# Altium footprint library DIP Component.PcbLib: 327 footprints (part 10 of 21)
Each footprint in its own frame and in the unit in brackets; x right, y up, seen from the top. Pads: shape width x height; smd on the part's side, far side on the other; paste and mask are expansions set on the pad; w line width, h text height; cw(c..) or ccw(c..) is an arc to the next point about the centre after c.
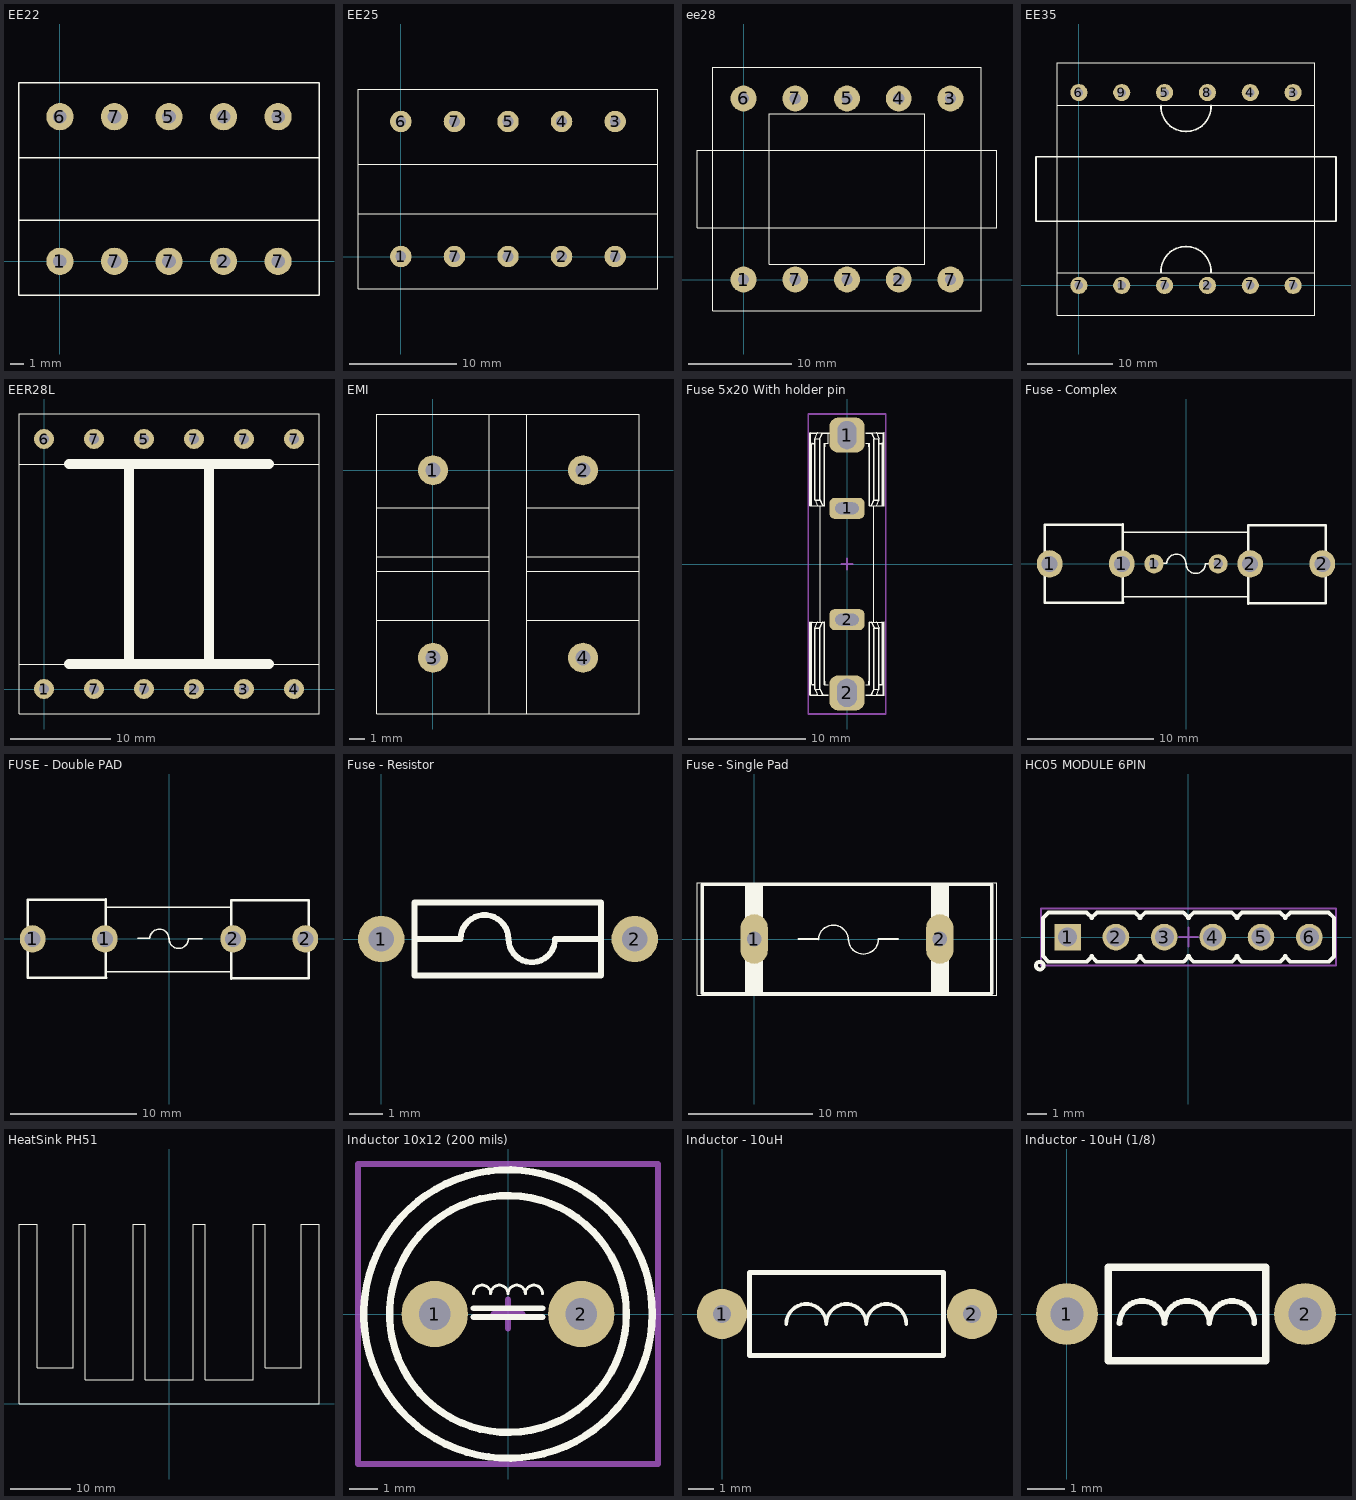
[diagram p9: the footprints below, top view; thin cyan lines are the x and y axes]

## EE22 [mm] "EE22"
pads (10):
  round 2 hole 1: 1(0,0) 2(12,0) 3(16,10.6) 4(12,10.6) 5(8,10.6) 6(0,10.6) 7(4,0) 7(4,10.6) 7(8,0) 7(16,0)
Top Overlay:
  lines w0.1: -3,3 19,3 ; -3,7.6 19,7.6 ; -3,-2.5 -1.5,-2.5 19,-2.5 19,13.1 -2.5,13.1 -3,13.1 -3,0 -3,-2.5

## EE25 [mm] "EE25"
pads (10):
  round 2 hole 1: 1(0,0) 2(15,0) 3(20,12.6) 4(15,12.6) 5(10,12.6) 6(0,12.6) 7(5,0) 7(5,12.6) 7(10,0) 7(20,0)
Top Overlay:
  lines w0.1: -4,4 24,4 ; -4,8.6 24,8.6 ; -4,-3 -4,0 -4,15.6 23,15.6 24,15.6 24,-3 -3,-3 -4,-3

## ee28 [mm] "ee28"
pads (10):
  round 2.5 hole 1.1: 1(0,0) 2(15,0) 3(20,17.5) 4(15,17.5) 5(10,17.5) 6(0,17.5) 7(5,0) 7(5,17.5) 7(10,0) 7(20,0)
Top Overlay:
  lines w0.1: -4.5,5 -4.5,12.5 24.5,12.5 24.5,8.5 24.5,5 -3.5,5 -4.5,5 ; -3,-3 -3,-2.5 -3,20.5 -2,20.5 23,20.5 23,-3 22.5,-3 -3,-3 ; 2.5,1.5 2.5,16 17.5,16 17.5,1.5 2.5,1.5

## EE35 [mm] "EE35"
pads (12):
  round 2 hole 1: 1(5,0) 2(15,0) 3(25,22.5) 4(20,22.5) 5(10,22.5) 6(0,22.5) 7(0,0) 7(10,0) 7(20,0) 7(25,0) 8(15,22.5) 9(5,22.5)
Top Overlay:
  lines w0.1: -2.5,1.5 27.5,1.5 ; -2.5,21 27.5,21 ; -2.5,-3.5 27.5,-3.5 27.5,-3 27.5,23.5 27.5,26 -2.5,26 -2.5,9 -2.5,0 -2.5,-3.5
  lines w0.2: 9.585,1.5 cw(c12.5,1.625) 15.415,1.5 ; 9.585,21 ccw(c12.5,20.875) 15.415,21 ; -5,7.5 30,7.5 30,12.5 30,15 25,15 -5,15 -5,8 -5,7.5

## EER28L [mm] "EER28L"
pads (12):
  round 2 hole 1: 1(0,0) 2(15,0) 3(20,0) 4(25,0) 5(10,25) 6(0,25) 7(5,0) 7(5,25) 7(10,0) 7(15,25) 7(20,25) 7(25,25)
Top Overlay:
  lines w0.1: -2.5,2.5 27.5,2.5 ; -2.5,22.5 27.5,22.5 ; -2.5,-2.5 -2.5,21 -2.5,27.5 27.5,27.5 27.5,12.5 27.5,-2.5 -2.5,-2.5
  lines w1: 2.5,2.5 22.5,2.5 ; 2.5,22.5 22.5,22.5 ; 8.5,22 8.5,2.5 16.5,2.5 16.5,22.5

## EMI [mm] "EMI"
pads (4):
  round 2 hole 1: 1(0,0) 2(10,0) 3(0,-12.5) 4(10,-12.5)
Top Overlay:
  lines w0.05: 3.75,-16.25 3.75,3.75 ; 3.75,-10 -3.75,-10 -3.75,-6.75 3.75,-6.75 3.75,-5.75 -3.75,-5.75 -3.75,-2.5 3.75,-2.5 ; 6.25,-16.25 6.25,3.75 ; 6.25,-10 13.75,-10 ; 6.25,-6.75 13.75,-6.75 ; 6.25,-5.75 13.75,-5.75 ; 6.25,-2.5 13.75,-2.5 ; -3.75,-16.25 -3.75,3.75 13.75,3.75 13.75,2.5 13.75,0 13.75,-16.25 -3.75,-16.25

## Fuse 5x20 With holder pin [mm] "Dsigner : Abbas Basereh"
height 8
pads (4):
  rrect50% 3x1.8 hole 1 slot 2 at 0 deg: 1(0,4.75) 2(0,-4.75)
  rrect50% 3x3 hole 1.6 slot 2.4 at 90 deg: 1(0,11)
  rrect50% 3x3 hole 1.7 slot 2.4 at 90 deg: 2(0,-11)
Top Overlay:
  drawing of 353 lines, arcs and shapes, not listed
Mechanical 15:
  lines w0.15: -0.5,0 0.5,0 ; 0,-0.5 0,0.5 ; -3.3,-12.8 3.3,-12.8 3.3,12.8 -3.3,12.8 -3.3,-12.8
3D body "User Library-Clips FC-201 with fuse 5x20.STEP": height 8.63, standoff -3.56, extent -3.173,-11.689 3.174,11.689

## Fuse - Complex [mil]
pads (6):
  oval 80x85 hole 50: 1(-425,0) 1(-200,0) 2(200,0) 2(425,0)
  round 60 hole 30: 1(-100,0) 2(100,0)
Top Overlay:
  lines w3.94: -197.37,99.1 194.69,99.1 ; -197.05,-102 194.69,-102
  lines w5: -97.77,1.22 -59.98,1.22 ; -59.97,1.22 cw(c-30,0) 0,0 ccw(c30,0) 60,0 104.09,0
  lines w7.87: -197.44,122.64 -197.05,0.2 -197.05,-121.06 ; -197.05,122.24 -440,122.24 -440,-121.46 -195.87,-121.46 ; 193.9,-123.43 435,-123.43 435,120.28 198.23,120.28 ; 194.69,-123.82 194.69,119.88
3D body "Fuse Leg_2009.STEP": height 377.88, standoff -129.94, extent -434,-121.46 -194,122.25
3D body "Fuse Small 1A.STEP": height 350.39, standoff 149.61, extent -392,-101 383.59,99.79
3D body "Fuse Leg_2009.STEP": height 377.88, standoff -129.94, extent 196,-119 436,124.71

## FUSE - Double PAD [mil]
pads (4):
  oval 80x85 hole 50: 1(-425,0) 1(-200,0) 2(200,0) 2(425,0)
Top Overlay:
  lines w3.94: -197.37,99.1 194.69,99.1 ; -197.05,-102 194.69,-102
  lines w5: -97.77,1.22 -59.98,1.22 ; -59.97,1.22 cw(c-30,0) 0,0 ccw(c30,0) 60,0 104.09,0
  lines w7.87: -197.44,122.64 -197.05,0.2 -197.05,-121.06 ; -197.05,122.24 -440,122.24 -440,-121.46 -195.87,-121.46 ; 193.9,-123.43 435,-123.43 435,120.28 198.23,120.28 ; 194.69,-123.82 194.69,119.88
3D body "Fuse Leg_2009.STEP": height 377.88, standoff -129.94, extent 196,-119 436,124.71
3D body "Fuse Small 1A.STEP": height 350.39, standoff 149.61, extent -392,-101 383.59,99.79
3D body "Fuse Leg_2009.STEP": height 377.88, standoff -129.94, extent -434,-121.46 -194,122.25

## Fuse - Resistor [mil]
pads (2):
  round 55 hole 30: 1(0,0) 2(300,0)
Top Overlay:
  lines w7: 39.37,0 93.81,0 cw(c122.2,0) 150.59,0 ccw(c178.15,0) 205.71,0 259.84,0
  lines w7.09: 39.37,-43.31 39.37,43.31 259.84,43.31 259.84,-43.31 39.37,-43.31

## Fuse - Single Pad [mm]
height 14
pads (2):
  oval 2.2x4 hole 1.2: 1(0,0) 2(15,0)
Top Overlay:
  rectangle: 14.29,-4.4 15.74,4.4
  rectangle: -0.74,-4.4 0.71,4.4
  lines w0.08: -4.62,-4.56 -4.62,4.56 19.62,4.56 19.62,-4.56 -4.62,-4.56
  lines w0.127: 5.178,-0.05 cw(c6.393,-0.1) 7.61,-0.1 ; 7.61,0 ccw(c8.827,0) 10.043,0
  lines w0.2: 3.6,0 5.17,0 ; 10.07,0 11.6,0
  lines w0.254: -4.2,-4.4 -4.2,4.4 19.2,4.4 19.2,-4.4 -4.2,-4.4

## HC05 MODULE 6PIN [mm] "HC05 box-Designer Abbas Basereh"
height 40
pads (6):
  rect 1.4x1.4 / inner rect 1.4x1.4 / far side rect 1.4x2.2 hole 1 mask+0.1: 1(-6.35,0)
  round 1.4 / inner round 1.4 / far side oval 1.4x2.2 hole 1 mask+0.1: 2(-3.81,0) 3(-1.27,0) 4(1.27,0) 5(3.81,0) 6(6.35,0)
Top Overlay:
  circle w0.2: c-7.81,-1.5 r0.2
  lines w0.2: -5.11,-1 -4.81,-1.3 -2.81,-1.3 -2.51,-1 ; -5.11,1 -4.81,1.3 -2.81,1.3 -2.51,1 ; -5.05,-1 -5.35,-1.3 -7.35,-1.3 -7.65,-1 -7.65,1 -7.35,1.3 -5.35,1.3 -5.05,1 ; -2.57,-1 -2.27,-1.3 -0.27,-1.3 0.03,-1 ; -2.57,1 -2.27,1.3 -0.27,1.3 0.03,1 ; -0.025,-1 0.275,-1.3 2.275,-1.3 2.575,-1 ; -0.025,1 0.275,1.3 2.275,1.3 2.575,1 ; 2.515,-1 2.815,-1.3 4.815,-1.3 5.115,-1 ; 2.515,1 2.815,1.3 4.815,1.3 5.115,1 ; 5.055,-1 5.355,-1.3 7.355,-1.3 7.64,-1.015 7.64,1.015 7.355,1.3 5.355,1.3 5.055,1
Mechanical 15:
  lines w0.1: -0.5,0 0.5,0 ; 0,-0.5 0,0.5 ; -7.75,-1.5 7.75,-1.5 7.75,1.5 -7.75,1.5 -7.75,-1.5
3D body "User Library-hc05.STEP": height 40, standoff -2.6, extent -8.025,-0.5 8.075,5.4

## HeatSink PH51 [mm]
Top Overlay:
  lines w0.178: -25.044,30.001 -21.999,30.001 -21.999,6.001 -16.001,6.001 -16.001,30.001 -13.999,30.001 -13.999,4.001 -6.001,4.001 -6.001,30.001 -3.999,30.001 -3.999,4.001 3.999,4.001 3.999,30.001 6.001,30.001 6.001,4.001 13.999,4.001 13.999,30.001 16.001,30.001 16.001,6.001 21.999,6.001 21.999,30.001 25.001,30.001 25.001,-0.001 -25.001,-0.001 -25.001,30.001
3D body: height 30.48, standoff 5.08, extent -25.001,-0.001 25.001,30.001

## Inductor 10x12 (200 mils) [mm] "POWER INDUCTOR 10x12 (200 mils) DESIGNER ABBAS BASEREH"
height 12
pads (2):
  round 2.3 hole 1.1: 1(-2.54,0) 2(2.54,0)
Top Overlay:
  circle w0.254: c0,0 r5
  circle w0.254: c0,0 r4.105
  lines w0.1: -1.2,0.7 cw(c-0.9,0.7) -0.6,0.7 cw(c-0.3,0.7) 0,0.7 cw(c0.3,0.7) 0.6,0.7 cw(c0.9,0.7) 1.2,0.7
  lines w0.2: -1.2,-0.1 1.2,-0.1 ; -1.2,0.2 1.2,0.2
Mechanical 15:
  lines w0.2: -0.5,0 0.5,0 ; 0,-0.5 0,0.5 ; -5.2,-5.2 5.2,-5.2 5.2,5.2 -5.2,5.2 -5.2,-5.2
3D body "User Library-Inductor 10x12 (200 mils).STEP": height 12.13, standoff -3.87, extent -5,-5 5,5

## Inductor - 10uH [mm]
pads (2):
  round 2 hole 0.7: 1(0,0) 2(10,0)
Top Overlay:
  lines w0.15: 2.571,-0.4 cw(c3.371,-0.4) 4.171,-0.4 cw(c4.971,-0.4) 5.771,-0.4 cw(c6.571,-0.4) 7.371,-0.4
  lines w0.2: 1.105,-1.67 1.105,1.67 8.865,1.67 8.865,-1.67 1.105,-1.67

## Inductor - 10uH (1/8) [mil]
pads (2):
  round 65 hole 35: 1(0,0) 2(250,0)
Top Overlay:
  lines w5.91: 55.12,-9.84 cw(c78.74,-9.84) 102.36,-9.84 cw(c125.98,-9.84) 149.61,-9.84 cw(c173.23,-9.84) 196.85,-9.84
  lines w7.87: 43.31,-49.21 43.31,49.21 208.66,49.21 208.66,-49.21 43.31,-49.21
3D body "Inductor.STEP": height 115.05, standoff -39.37, extent -10,-36.24 260,36.24